# Altium schematic symbol library LTSpiceLibrary.SchLib: 776 symbols (part 1 of 3)
Pins are listed as number, name and electrical type; pins without a type are passive.

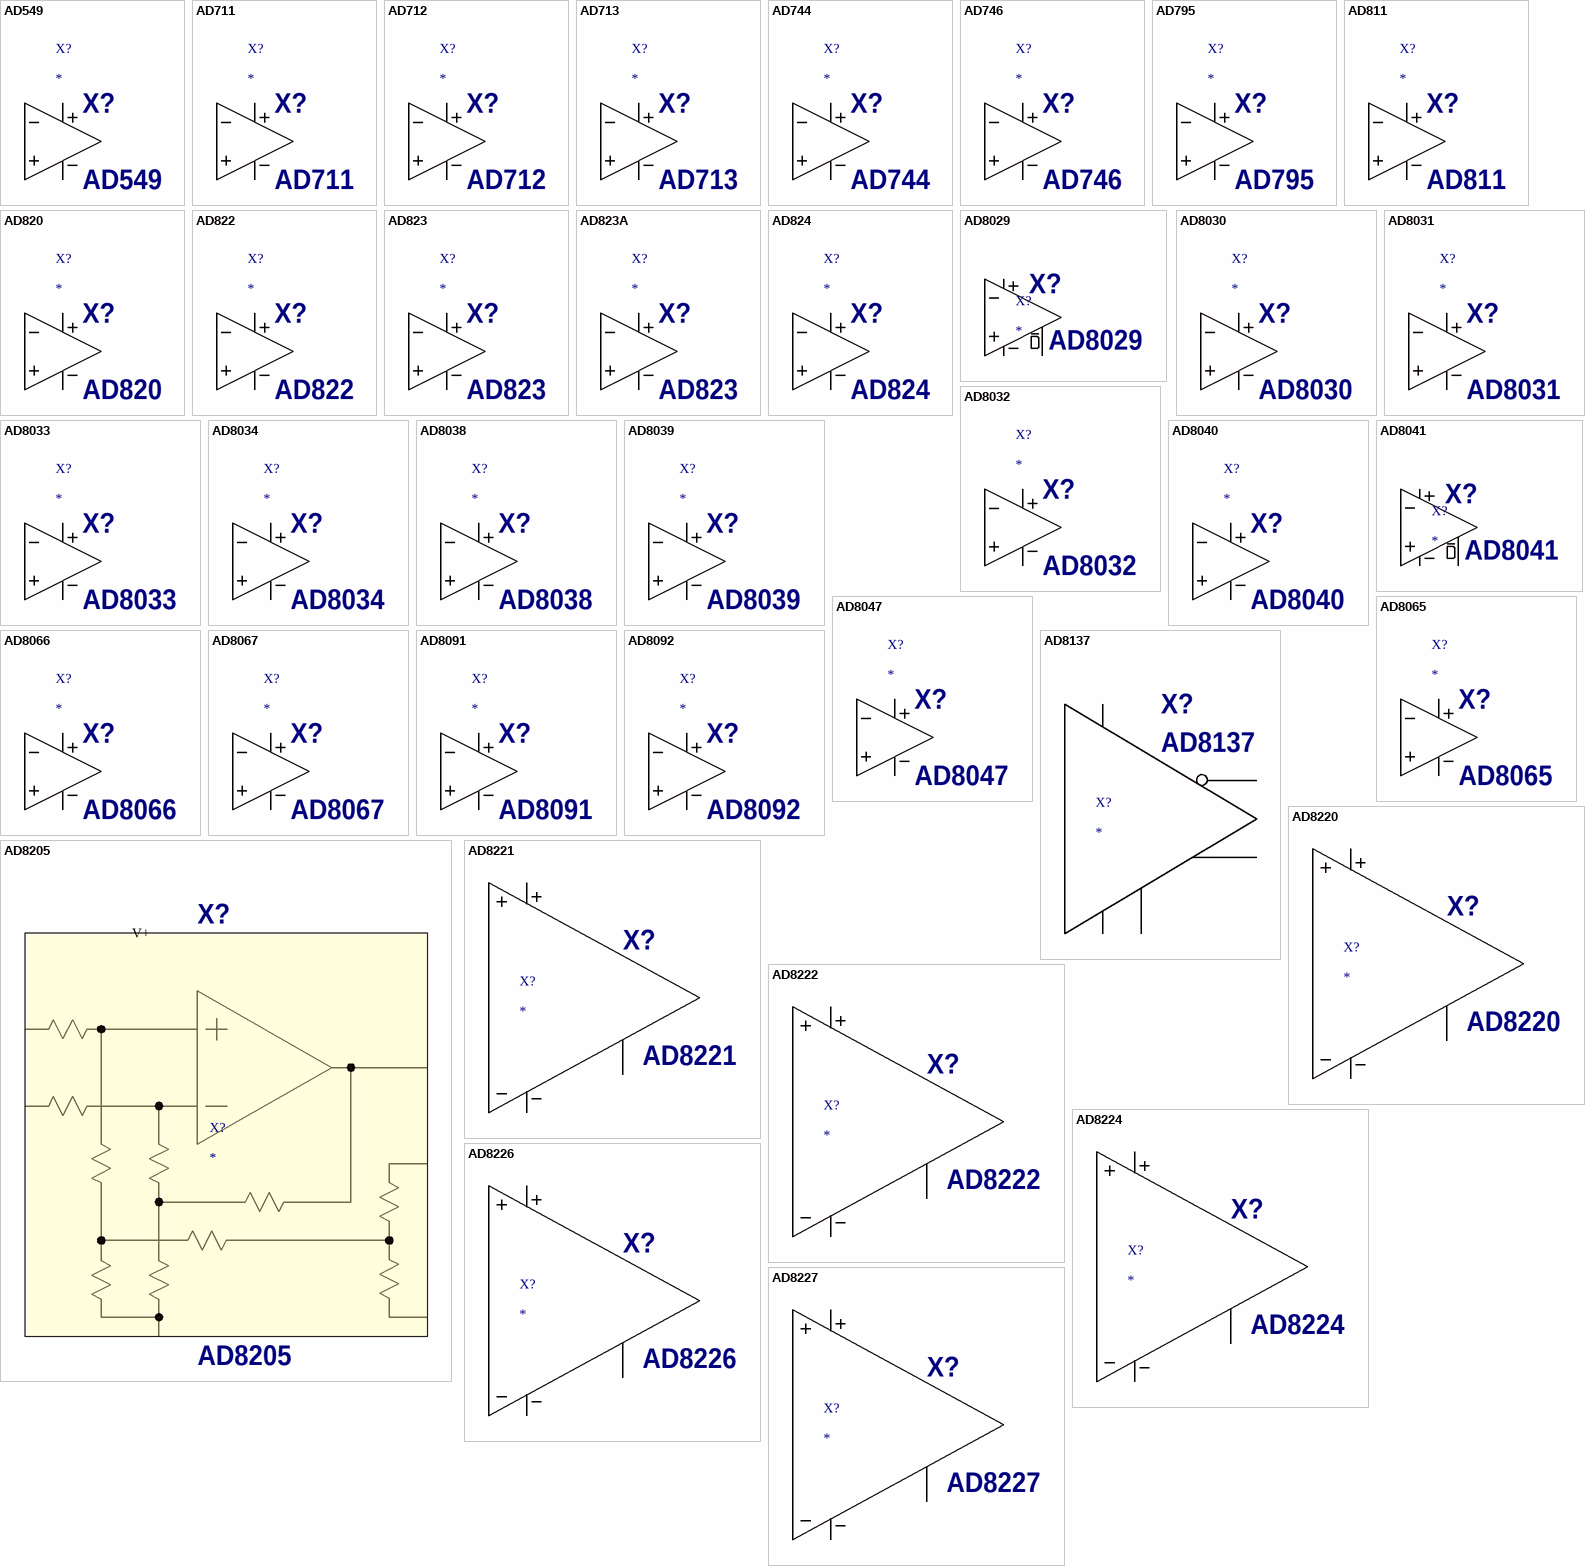
[diagram p0: symbols AD549 to AD8227]

## AD549
designator X?  value AD549  InstName: X?
Prefix: X; Description: Precision Low-Cost HS BiFET Dual Op Amp; SpiceModel: ADI1.lib; Value2: AD549
pins: 1 In+, 2 In-, 3 V+, 4 V-, 5 OUT

## AD711
designator X?  value AD711  InstName: X?
Prefix: X; Value2: AD712; Description: Precision Low-Cost HS BiFET Op Amp; SpiceModel: ADI1.lib
pins: 1 In+, 2 In-, 3 V+, 4 V-, 5 OUT

## AD712
designator X?  value AD712  InstName: X?
Prefix: X; Description: Precision Low-Cost HS BiFET Dual Op Amp; SpiceModel: ADI1.lib; Value2: AD712
pins: 1 In+, 2 In-, 3 V+, 4 V-, 5 OUT

## AD713
designator X?  value AD713  InstName: X?
Prefix: X; Value2: AD712; Description: Precision Low-Cost HS BiFET Quad Op Amp; SpiceModel: ADI1.lib
pins: 1 In+, 2 In-, 3 V+, 4 V-, 5 OUT

## AD744
designator X?  value AD744  InstName: X?
Prefix: X; Value2: AD746; Description: Precision, 500ns Settling BiFET Op Amp; SpiceModel: ADI1.lib
pins: 1 In+, 2 In-, 3 V+, 4 V-, 5 OUT

## AD746
designator X?  value AD746  InstName: X?
Prefix: X; Description: Dual Precision, 500ns Settling BiFET Op Amp; SpiceModel: ADI1.lib; Value2: AD746
pins: 1 In+, 2 In-, 3 V+, 4 V-, 5 OUT

## AD795
designator X?  value AD795  InstName: X?
Prefix: X; Description: Low Power Low Noise Precision FET Op Amp; SpiceModel: ADI1.lib; Value2: AD795
pins: 1 In+, 2 In-, 3 V+, 4 V-, 5 OUT

## AD811
designator X?  value AD811  InstName: X?
Prefix: X; Description: High Performance Video Op Amp; SpiceModel: ADI.lib; Value2: AD811
pins: 1 In+, 2 In-, 3 V+, 4 V-, 5 OUT

## AD820
designator X?  value AD820  InstName: X?
Prefix: X; Description: Single/Dual Supply Rail to Rail output Low Power FET Input Op Amp; SpiceModel: ADI1.lib; Value2: AD820
pins: 1 In+, 2 In-, 3 V+, 4 V-, 5 OUT

## AD822
designator X?  value AD822  InstName: X?
Prefix: X; Value2: AD820; Description: Dual Single/Dual Supply Rail to Rail output Low Power FET Input Op Amp; SpiceModel: ADI1.lib
pins: 1 In+, 2 In-, 3 V+, 4 V-, 5 OUT

## AD823
designator X?  value AD823  InstName: X?
Prefix: X; Description: Dual 16 MHz Rail-toRail FET Input Amplifier; SpiceModel: ADI.lib; Value2: AD823
pins: 1 In+, 2 In-, 3 V+, 4 V-, 5 OUT

## AD823A
designator X?  value AD823  InstName: X?
Prefix: X; Description: Dual 16 MHz Rail-toRail FET Input Amplifier; SpiceModel: ADI.lib; Value2: AD823
pins: 1 In+, 2 In-, 3 V+, 4 V-, 5 OUT

## AD824
designator X?  value AD824  InstName: X?
Prefix: X; Value2: AD820; Description: Quad Single/Dual Supply Rail to Rail output Low Power FET Input Op Amp; SpiceModel: ADI1.lib
pins: 1 In+, 2 In-, 3 V+, 4 V-, 5 OUT

## AD8029
designator X?  value AD8029  InstName: X?
Prefix: X; Description: High-Speed Operational Amplifier; SpiceModel: ADI.lib; Value2: AD8029
pins: 1 In+, 2 In-, 3 V+, 4 V-, 5 OUT, 6 SHDN

## AD8030
designator X?  value AD8030  InstName: X?
Prefix: X; Value2: AD8040; Description: Dual High-Speed Operational Amplifier; SpiceModel: ADI.lib
pins: 1 In+, 2 In-, 3 V+, 4 V-, 5 OUT

## AD8031
designator X?  value AD8031  InstName: X?
Prefix: X; Description: 2.7V 80 MHz rail-rail op amp; SpiceModel: ADI.lib; Value2: AD8031
pins: 1 In+, 2 In-, 3 V+, 4 V-, 5 OUT

## AD8032
designator X?  value AD8032  InstName: X?
Prefix: X; Value2: AD8031; Description: Dual 2.7V 80 MHz rail-rail op amp; SpiceModel: ADI.lib
pins: 1 In+, 2 In-, 3 V+, 4 V-, 5 OUT

## AD8033
designator X?  value AD8033  InstName: X?
Prefix: X; Description: 85MHz  FET Input Amplifier; SpiceModel: ADI.lib; Value2: AD8033
pins: 1 In+, 2 In-, 3 V+, 4 V-, 5 OUT

## AD8034
designator X?  value AD8034  InstName: X?
Prefix: X; Value2: AD8033; Description: Dual 85MHz  FET Input Amplifier; SpiceModel: ADI.lib
pins: 1 In+, 2 In-, 3 V+, 4 V-, 5 OUT

## AD8038
designator X?  value AD8038  InstName: X?
Prefix: X; Description: Low-Power 350MHz op amp; SpiceModel: ADI.lib; Value2: AD8038
pins: 1 In+, 2 In-, 3 V+, 4 V-, 5 OUT

## AD8039
designator X?  value AD8039  InstName: X?
Prefix: X; Value2: AD8038; Description: Dual Low-Power 350MHz op amp; SpiceModel: ADI.lib
pins: 1 In+, 2 In-, 3 V+, 4 V-, 5 OUT

## AD8040
designator X?  value AD8040  InstName: X?
Prefix: X; Description: Quad High-Speed Operational Amplifier; SpiceModel: ADI.lib; Value2: AD8040
pins: 1 In+, 2 In-, 3 V+, 4 V-, 5 OUT

## AD8041
designator X?  value AD8041  InstName: X?
Prefix: X; Description: 160MHz Rail-to-Rail Amplifier with Disable; SpiceModel: ADI.lib; Value2: AD8041
pins: 1 In+, 2 In-, 3 V+, 4 V-, 5 OUT, 6 SHDN

## AD8047
designator X?  value AD8047  InstName: X?
Prefix: X; Description: 250MHz (G=1) voltage feedback op amp; SpiceModel: ADI.lib; Value2: AD8047
pins: 1 In+, 2 In-, 3 V+, 4 V-, 5 OUT

## AD8065
designator X?  value AD8065  InstName: X?
Prefix: X; Description: Single 135MHz low noise FET Input Amp; SpiceModel: ADI.lib; Value2: AD8065
pins: 1 In+, 2 In-, 3 V+, 4 V-, 5 OUT

## AD8066
designator X?  value AD8066  InstName: X?
Prefix: X; Description: Dual low-cost high-speed FET input amp; SpiceModel: ADI.lib; Value2: AD8066
pins: 1 In+, 2 In-, 3 V+, 4 V-, 5 OUT

## AD8067
designator X?  value AD8067  InstName: X?
Prefix: X; Description: 250MHz Precision FastFET Op-Amp; SpiceModel: ADI.lib; Value2: AD8067
pins: 1 In+, 2 In-, 3 V+, 4 V-, 5 OUT

## AD8091
designator X?  value AD8091  InstName: X?
Prefix: X; Description: Single 110MHz rail-to-rail op amp 2.7V; SpiceModel: ADI.lib; Value2: AD8091
pins: 1 In+, 2 In-, 3 V+, 4 V-, 5 OUT

## AD8092
designator X?  value AD8092  InstName: X?
Prefix: X; Description: Dual 110MHz rail-to-rail op amp 2.7V; SpiceModel: ADI.lib; Value2: AD8092
pins: 1 In+, 2 In-, 3 V+, 4 V-, 5 OUT

## AD8137
designator X?  value AD8137  InstName: X?
Prefix: X; Description: Low Cost, Low Power, Differential ADC Driver; SpiceModel: AD8137.lib; Value2: AD8137
pins: 1 3a, 2 9, 3 99, 4 50, 5 71B, 6 71, 7 110

## AD8205
designator X?  value AD8205  InstName: X?
Prefix: X; Description: Single-Supply 42V System Difference Amplifier; SpiceModel: ADI.lib; Value2: AD8205
pins: 1 -IN, 2 GND, 3 Vref2, 4 OUT, 5 V+, 6 Vref1, 7 +IN

## AD8220
designator X?  value AD8220  InstName: X?
Prefix: X; Description: JFET Input In-Amp with R-R Out in MSOP pkg; SpiceModel: ADI1.lib; Value2: AD8220
pins: 1 IN-, 2 RG1, 3 RG2, 4 IN+, 5 VEE, 6 REF, 7 OUT, 8 VCC

## AD8221
designator X?  value AD8221  InstName: X?
Prefix: X; Description: Precision In-Amp; SpiceModel: ADI1.lib; Value2: AD8221
pins: 1 IN-, 2 RG1, 3 RG2, 4 IN+, 5 VEE, 6 REF, 7 OUT, 8 VCC

## AD8222
designator X?  value AD8222  InstName: X?
Prefix: X; Description: Precision Dual Channel In-Amp; SpiceModel: ADI1.lib; Value2: AD8222
pins: 1 IN-, 2 RG1, 3 RG2, 4 IN+, 5 VEE, 6 REF, 7 OUT, 8 VCC

## AD8224
designator X?  value AD8224  InstName: X?
Prefix: X; Description: Precision Dual Channel JFET R-R in In-Amp; SpiceModel: ADI1.lib; Value2: AD8224
pins: 1 IN-, 2 RG1, 3 RG2, 4 IN+, 5 VEE, 6 REF, 7 OUT, 8 VCC

## AD8226
designator X?  value AD8226  InstName: X?
Prefix: X; Description: Wide Supply Range R-R output In-Amp; SpiceModel: ADI1.lib; Value2: AD8226
pins: 1 IN-, 2 RG1, 3 RG2, 4 IN+, 5 VEE, 6 REF, 7 OUT, 8 VCC

## AD8227
designator X?  value AD8227  InstName: X?
Prefix: X; Description: Wide Supply Range R-R output In-Amp; SpiceModel: ADI1.lib; Value2: AD8227
pins: 1 IN-, 2 RG1, 3 RG2, 4 IN+, 5 VEE, 6 REF, 7 OUT, 8 VCC

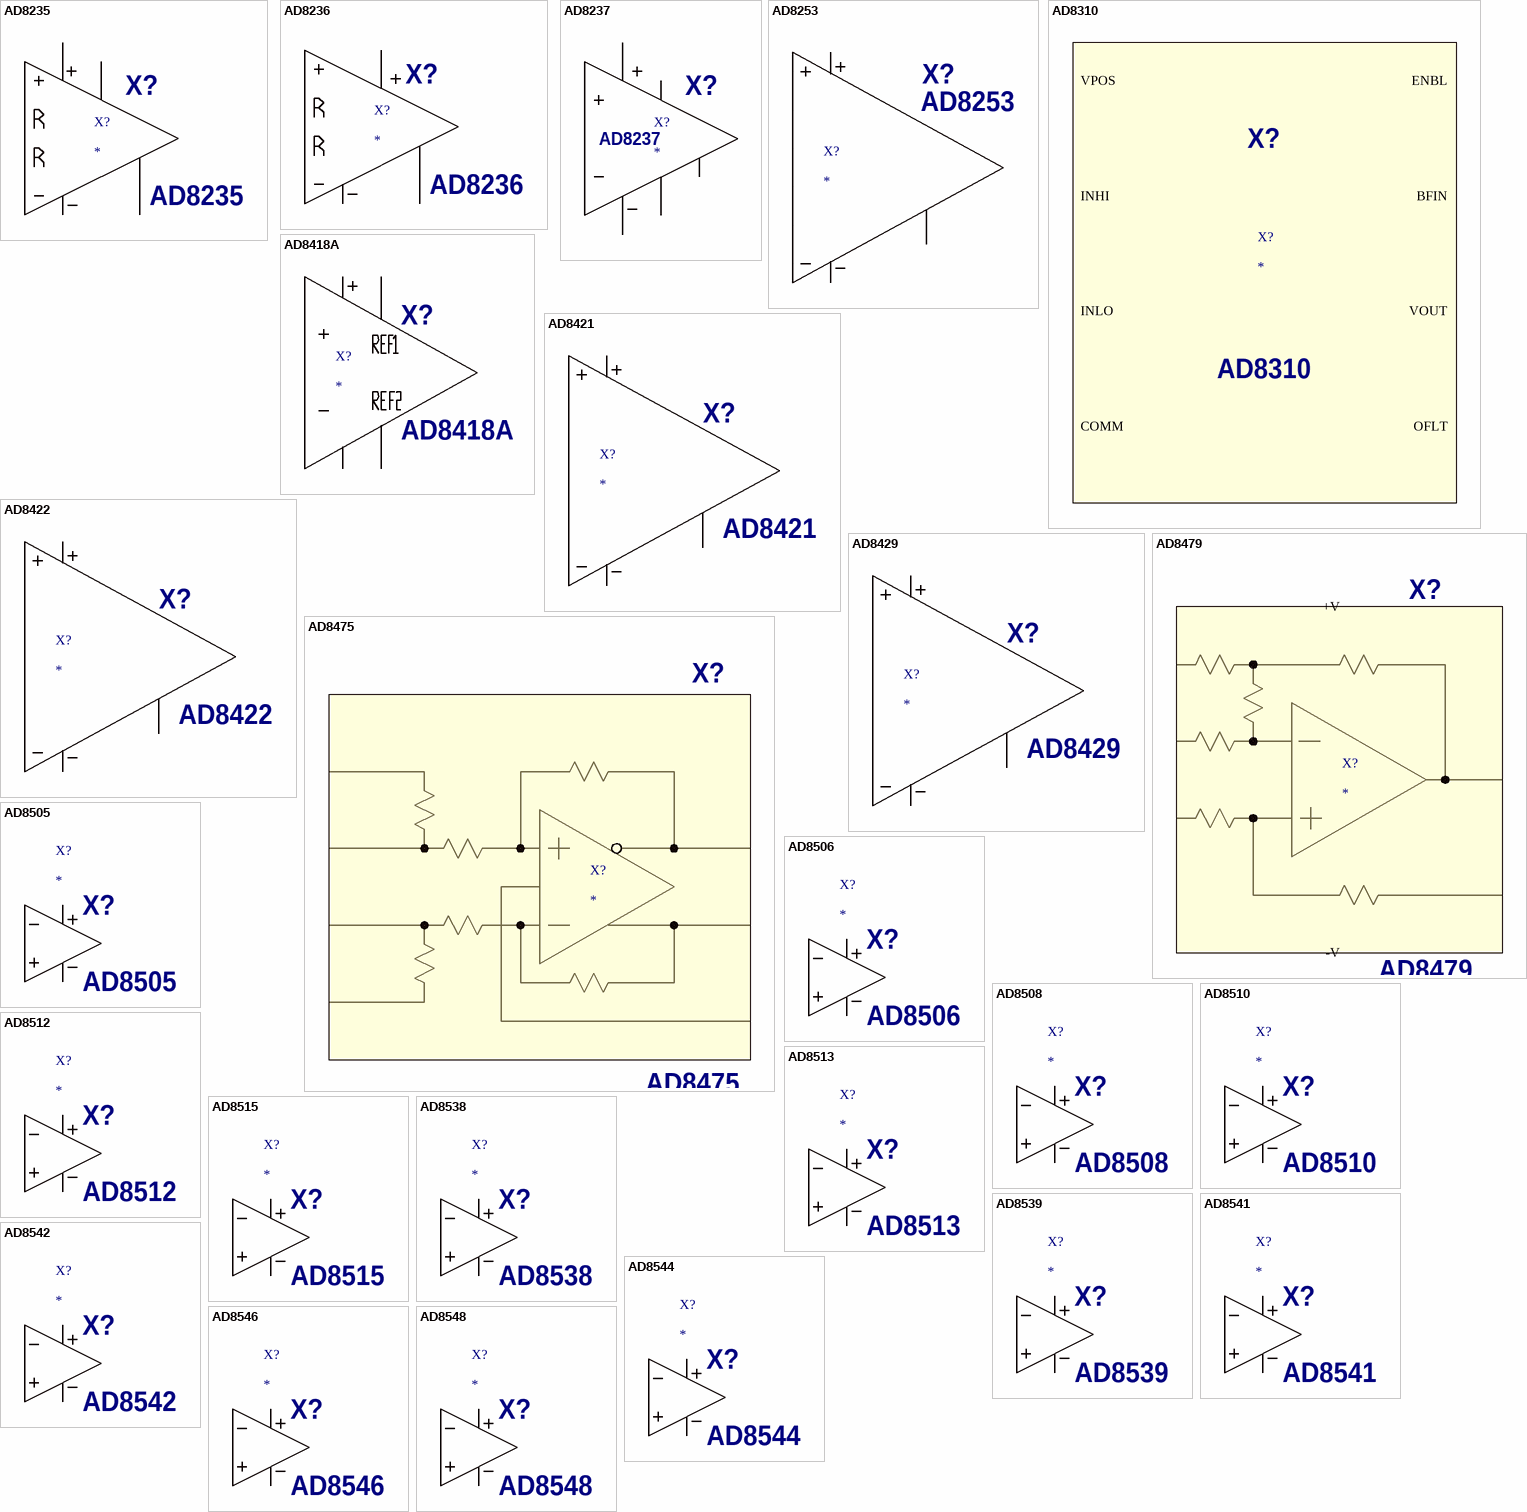
[diagram p1: symbols AD8235 to AD8548]

## AD8235
designator X?  value AD8235  InstName: X?
Prefix: X; Description: �Power Precision Instrumentation Amplifier; SpiceModel: ADI1.lib; Value2: AD8235
pins: 1 FB, 2 RG2, 3 RG1, 4 In+, 5 SDN, 6 V-, 7 REF, 8 OUT, 9 V+

## AD8236
designator X?  value AD8236  InstName: X?
Prefix: X; Description: 40 �A �Power Instrumentation Amplifier w/zero Crossover Distortion; SpiceModel: ADI1.lib; Value2: AD8236
pins: 1 FB, 2 RG2, 3 RG1, 4 In+, 5 V-, 6 REF, 7 OUT, 8 V+

## AD8237
designator X?  value AD8237  InstName: X?
Prefix: X; Description: Micropower, Zero Drift, True Rail-to-Rail Instrumentation Amplifier; ModelFile: AD8237.lib
pins: 1, 2, 3, 4, 5, 6, 7, 8

## AD8253
designator X?  value AD8253  InstName: X?
Prefix: X; Description: 10 MHz, 20 V/us, G=1, 10, 100, 1000 iCMOS Programmable Gain Instrumentation Amplifier; SpiceModel: AD8253.lib; Value2: AD8253
pins: 1 -IN, 2 DGND, 3 -VS, 4 A0, 5 A1, 6 WR, 7 OUT, 8 +VS, 9 REF, 10 +IN

## AD8310
designator X?  value AD8310  InstName: X?
Prefix: X; Description: Fast, Voltage-Out, DC to 440MHz, 95dB Logartihmic Amplifier; SpiceModel: AD8310.lib; Value2: AD8310
pins: 1 INLO, 2 COMM, 3 OFLT, 4 VOUT, 5 VPOS, 6 BFIN, 7 ENBL, 8 INHI

## AD8418A
designator X?  value AD8418A  InstName: X?
Prefix: X; Description: Bidirectional G of 20 Current Sense Amplifier; SpiceModel: ADI1.lib; Value2: AD8418A
pins: 1 IN-, 2 GND, 3 REF2, 4 OUT, 5 VS, 6 REF1, 7 IN+

## AD8421
designator X?  value AD8421  InstName: X?
Prefix: X; Description: 3 nV/"Hz, Low Power In-Amp; SpiceModel: ADI1.lib; Value2: AD8421
pins: 1 IN-, 2 RG1, 3 RG2, 4 IN+, 5 VEE, 6 REF, 7 OUT, 8 VCC

## AD8422
designator X?  value AD8422  InstName: X?
Prefix: X; Description: High Performance, Low Power, R-R Precision In-Amp; SpiceModel: ADI1.lib; Value2: AD8422
pins: 1 IN-, 2 RG1, 3 RG2, 4 IN+, 5 VEE, 6 REF, 7 OUT, 8 VCC

## AD8429
designator X?  value AD8429  InstName: X?
Prefix: X; Description: 1 nV/"Hz Low Noise In-Amp; SpiceModel: ADI1.lib; Value2: AD8429
pins: 1 IN-, 2 RG1, 3 RG2, 4 IN+, 5 VEE, 6 REF, 7 OUT, 8 VCC

## AD8475
designator X?  value AD8475  InstName: X?
Prefix: X; Description: Precision, Selectable Gain, Fully Differential Funnel Amplifier; SpiceModel: AD8475.lib; Value2: AD8475
pins: 1 -IN 0.8x, 2 -IN 0.4x, 3 +VS, 4 VOCM, 5 +OUT, 6 -OUT, 7 -VS, 8 +IN 0.4x, 9 +IN 0.8x

## AD8479
designator X?  value AD8479  InstName: X?
Prefix: X; Description: Very High Common-Mode Voltage Precision Difference Amplifier; SpiceModel: ADI.lib; Value2: AD8479
pins: 1 REF-, 2 -IN, 3 +IN, 4 -V, 5 REF+, 6 OUTPUT, 7 +V

## AD8505
designator X?  value AD8505  InstName: X?
Prefix: X; Description: 20 �A Maximum, Rail-to-Rail I/O, Zero Input Crossover Distortion Amplifier; Value2: AD8505; SpiceModel: ADI1.lib
pins: 1 In+, 2 In-, 3 V+, 4 V-, 5 OUT

## AD8506
designator X?  value AD8506  InstName: X?
Prefix: X; Description: Dual 20 �A maximum Rail to Rail I/O Zero Input Crossover Distortion Amplifier; Value2: AD8506; SpiceModel: ADI1.lib
pins: 1 In+, 2 In-, 3 V+, 4 V-, 5 OUT

## AD8508
designator X?  value AD8508  InstName: X?
Prefix: X; Description: Quad 20 �A maximum Rail to Rail I/O Zero Input Crossover Distortion Amplifier; Value2: AD8508; SpiceModel: ADI1.lib
pins: 1 In+, 2 In-, 3 V+, 4 V-, 5 OUT

## AD8510
designator X?  value AD8510  InstName: X?
Prefix: X; Description: Very Low Noise, Low Input Bias Current, Wide Bandwidth JFET Operational Amplifier; SpiceModel: ADI.lib; Value2: AD8510
pins: 1 In+, 2 In-, 3 V+, 4 V-, 5 OUT

## AD8512
designator X?  value AD8512  InstName: X?
Prefix: X; Value2: AD8510; Description: Dual Very Low Noise, Low Input Bias Current, Wide Bandwidth JFET Operational Amplifier; SpiceModel: ADI.lib
pins: 1 In+, 2 In-, 3 V+, 4 V-, 5 OUT

## AD8513
designator X?  value AD8513  InstName: X?
Prefix: X; Value2: AD8510; Description: Quad Very Low Noise, Low Input Bias Current, Wide Bandwidth JFET Operational Amplifier; SpiceModel: ADI.lib
pins: 1 In+, 2 In-, 3 V+, 4 V-, 5 OUT

## AD8515
designator X?  value AD8515  InstName: X?
Prefix: X; Description: 1.8/5V CMOS OP Low Pwr RRIO; SpiceModel: ADI.lib; Value2: AD8515
pins: 1 In+, 2 In-, 3 V+, 4 V-, 5 OUT

## AD8538
designator X?  value AD8538  InstName: X?
Prefix: X; Description: 2.7/5V, CMOS, OP, Zero Drift, RRIO, Single; SpiceModel: ADI.lib; Value2: AD8538
pins: 1 In+, 2 In-, 3 V+, 4 V-, 5 OUT

## AD8539
designator X?  value AD8539  InstName: X?
Prefix: X; Description: 2.7/5V, CMOS, OP, Zero Drift, RRIO, Dual; SpiceModel: ADI.lib; Value2: AD8539
pins: 1 In+, 2 In-, 3 V+, 4 V-, 5 OUT

## AD8541
designator X?  value AD8541  InstName: X?
Prefix: X; Description: 2.7/5V CMOS OP Low Pwr RRIO; SpiceModel: AD8541.lib; Value2: AD8541
pins: 1 In+, 2 In-, 3 V+, 4 V-, 5 OUT

## AD8542
designator X?  value AD8542  InstName: X?
Prefix: X; Description: 2.7/5V CMOS OP Low Pwr RRIO; SpiceModel: ADI.lib; Value2: AD8542
pins: 1 In+, 2 In-, 3 V+, 4 V-, 5 OUT

## AD8544
designator X?  value AD8544  InstName: X?
Prefix: X; Description: 2.7/5V CMOS OP Low Pwr RRIO; SpiceModel: ADI.lib; Value2: AD8544
pins: 1 In+, 2 In-, 3 V+, 4 V-, 5 OUT

## AD8546
designator X?  value AD8546  InstName: X?
Prefix: X; Description: 3/18V CMOS OP Low Pwr RRIO; SpiceModel: ADI.lib; Value2: AD8546
pins: 1 In+, 2 In-, 3 V+, 4 V-, 5 OUT

## AD8548
designator X?  value AD8548  InstName: X?
Prefix: X; Description: 3/18V CMOS OP Low Pwr RRIO; SpiceModel: ADI.lib; Value2: AD8548
pins: 1 In+, 2 In-, 3 V+, 4 V-, 5 OUT

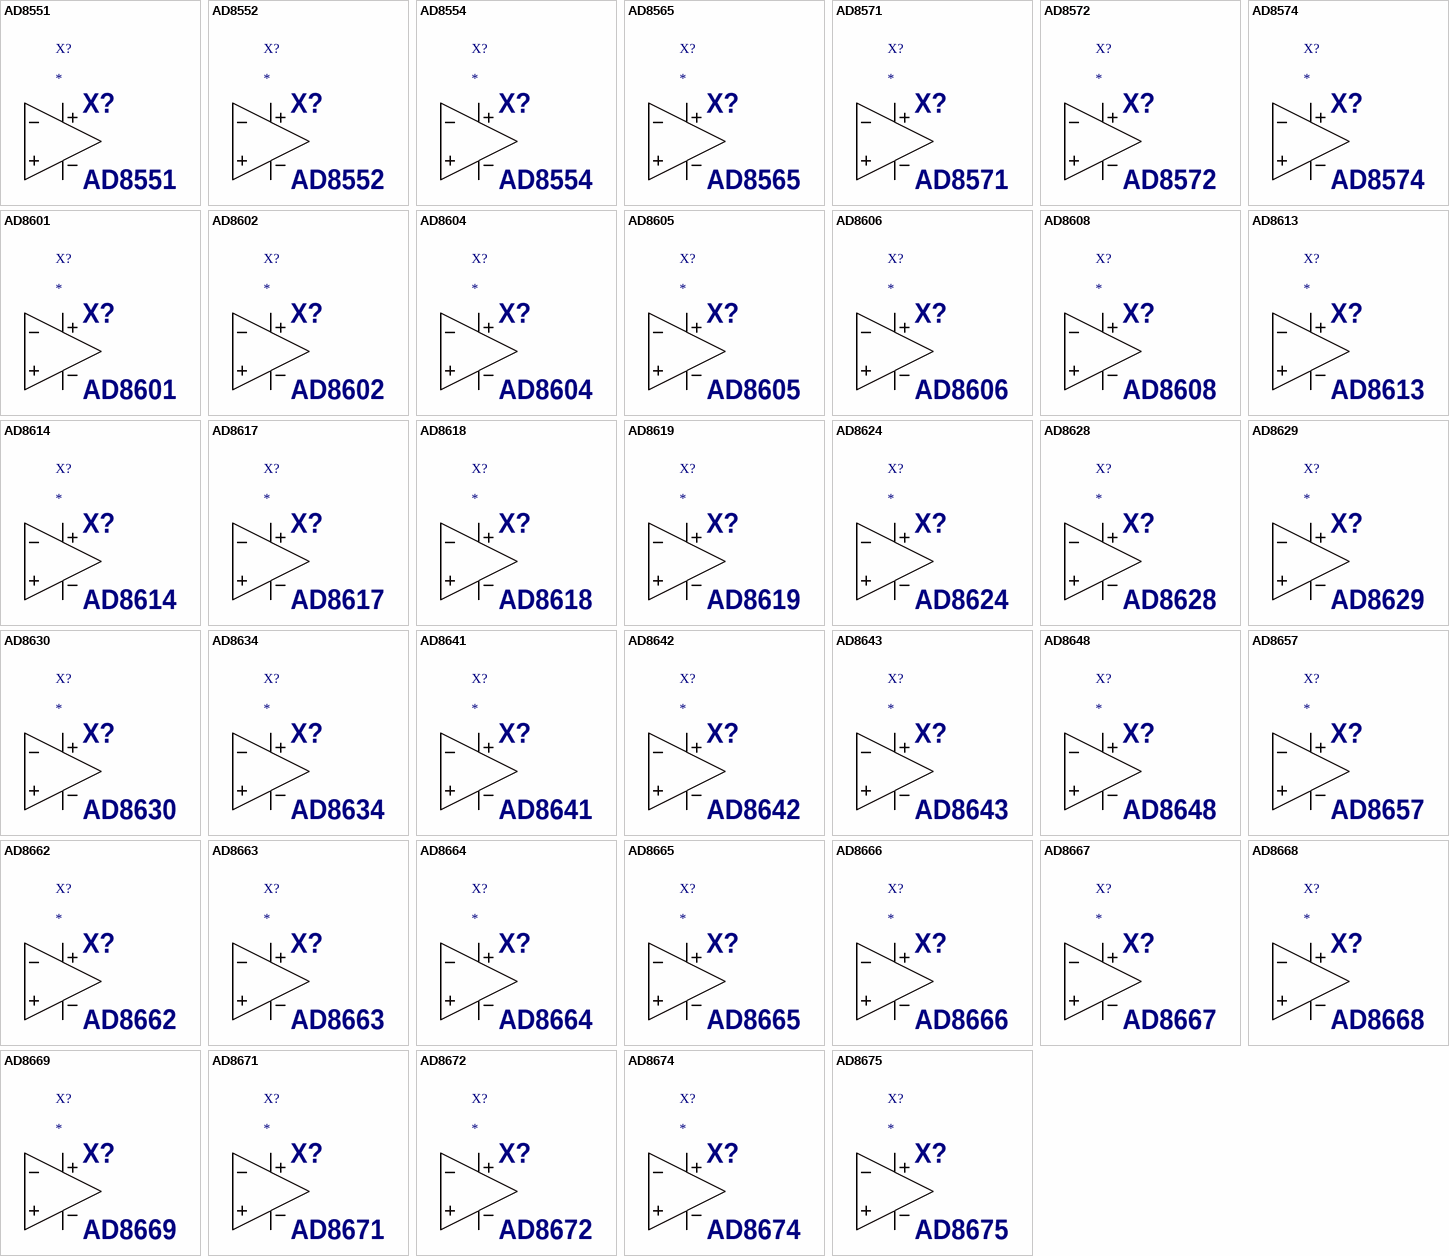
[diagram p2: symbols AD8551 to AD8675]

## AD8551
designator X?  value AD8551  InstName: X?
Prefix: X; Description: 2.7/5V, CMOS, OP, Zero Drift, RRIO, Single; SpiceModel: ADI.lib; Value2: AD8551
pins: 1 In+, 2 In-, 3 V+, 4 V-, 5 OUT

## AD8552
designator X?  value AD8552  InstName: X?
Prefix: X; Description: 2.7/5V, CMOS, OP, Zero Drift, RRIO, Dual; SpiceModel: ADI.lib; Value2: AD8552
pins: 1 In+, 2 In-, 3 V+, 4 V-, 5 OUT

## AD8554
designator X?  value AD8554  InstName: X?
Prefix: X; Description: 2.7/5V, CMOS, OP, Zero Drift, RRIO, Quad; SpiceModel: ADI.lib; Value2: AD8554
pins: 1 In+, 2 In-, 3 V+, 4 V-, 5 OUT

## AD8565
designator X?  value AD8565  InstName: X?
Prefix: X; Description: 16 V Rail-to-Rail Operational Amplifier (Single); SpiceModel: ADI1.lib; Value2: AD8565
pins: 1 In+, 2 In-, 3 V+, 4 V-, 5 OUT

## AD8571
designator X?  value AD8571  InstName: X?
Prefix: X; Description: 2.7/5V, CMOS, OP, Zero Drift, RRIO, Single; SpiceModel: ADI.lib; Value2: AD8571
pins: 1 In+, 2 In-, 3 V+, 4 V-, 5 OUT

## AD8572
designator X?  value AD8572  InstName: X?
Prefix: X; Description: 2.7/5V, CMOS, OP, Zero Drift, RRIO, Dual; SpiceModel: ADI.lib; Value2: AD8572
pins: 1 In+, 2 In-, 3 V+, 4 V-, 5 OUT

## AD8574
designator X?  value AD8574  InstName: X?
Prefix: X; Description: 2.7/5V, CMOS, OP, Zero Drift, RRIO, Quad; SpiceModel: ADI.lib; Value2: AD8574
pins: 1 In+, 2 In-, 3 V+, 4 V-, 5 OUT

## AD8601
designator X?  value AD8601  InstName: X?
Prefix: X; Description: 2.7/5V CMOS OP Low Vos RRIO; SpiceModel: ADI.lib; Value2: AD8601
pins: 1 In+, 2 In-, 3 V+, 4 V-, 5 OUT

## AD8602
designator X?  value AD8602  InstName: X?
Prefix: X; Description: 2.7/5V CMOS OP Low Vos RRIO; SpiceModel: ADI.lib; Value2: AD8602
pins: 1 In+, 2 In-, 3 V+, 4 V-, 5 OUT

## AD8604
designator X?  value AD8604  InstName: X?
Prefix: X; Description: 2.7/5V CMOS OP Low Vos RRIO; SpiceModel: ADI.lib; Value2: AD8604
pins: 1 In+, 2 In-, 3 V+, 4 V-, 5 OUT

## AD8605
designator X?  value AD8605  InstName: X?
Prefix: X; Description: 2.7/5V CMOS OP Low Noise RRIO; SpiceModel: ADI.lib; Value2: AD8605
pins: 1 In+, 2 In-, 3 V+, 4 V-, 5 OUT

## AD8606
designator X?  value AD8606  InstName: X?
Prefix: X; Description: 7/5V CMOS OP Low Noise RRIO; SpiceModel: ADI.lib; Value2: AD8606
pins: 1 In+, 2 In-, 3 V+, 4 V-, 5 OUT

## AD8608
designator X?  value AD8608  InstName: X?
Prefix: X; Description: 2.7/5V CMOS OP Low Noise RRIO; SpiceModel: ADI.lib; Value2: AD8608
pins: 1 In+, 2 In-, 3 V+, 4 V-, 5 OUT

## AD8613
designator X?  value AD8613  InstName: X?
Prefix: X; Description: Low Cost Micropower, Low Noise CMOS Rail-to-Rail, Input/Output Operational Amplifier; Value2: AD8613; SpiceModel: ADI1.lib
pins: 1 In+, 2 In-, 3 V+, 4 V-, 5 OUT

## AD8614
designator X?  value AD8614  InstName: X?
Prefix: X; Description: Single high-voltage LCD driver; SpiceModel: ADI.lib; Value2: AD8614
pins: 1 In+, 2 In-, 3 V+, 4 V-, 5 OUT

## AD8617
designator X?  value AD8617  InstName: X?
Prefix: X; Description: Dual Low Cost Micropower, Low Noise CMOS Rail-to-Rail, Input/Output Operational Amplifier; Value2: AD8617; SpiceModel: ADI1.lib
pins: 1 In+, 2 In-, 3 V+, 4 V-, 5 OUT

## AD8618
designator X?  value AD8618  InstName: X?
Prefix: X; Description: 2.7/5V CMOS OP Fast RRIO; SpiceModel: ADI.lib; Value2: AD8618
pins: 1 In+, 2 In-, 3 V+, 4 V-, 5 OUT

## AD8619
designator X?  value AD8619  InstName: X?
Prefix: X; Description: Quad Low Cost Micropower, Low Noise CMOS Rail-to-Rail, Input/Output Operational Amplifier; Value2: AD8619; SpiceModel: ADI1.lib
pins: 1 In+, 2 In-, 3 V+, 4 V-, 5 OUT

## AD8624
designator X?  value AD8624  InstName: X?
Prefix: X; Description: 5/30V BIP OP Low Noise RRO; SpiceModel: ADI.lib; Value2: AD8624
pins: 1 In+, 2 In-, 3 V+, 4 V-, 5 OUT

## AD8628
designator X?  value AD8628  InstName: X?
Prefix: X; Description: 2.7/5V, CMOS, OP, Zero Drift, RRIO, Single; SpiceModel: ADI.lib; Value2: AD8628
pins: 1 In+, 2 In-, 3 V+, 4 V-, 5 OUT

## AD8629
designator X?  value AD8629  InstName: X?
Prefix: X; Description: 2.7/5V, CMOS, OP, Zero Drift, RRIO, Dual; SpiceModel: ADI.lib; Value2: AD8629
pins: 1 In+, 2 In-, 3 V+, 4 V-, 5 OUT

## AD8630
designator X?  value AD8630  InstName: X?
Prefix: X; Description: 2.7/5V, CMOS, OP, Zero Drift, RRIO, Quad; SpiceModel: ADI.lib; Value2: AD8630
pins: 1 In+, 2 In-, 3 V+, 4 V-, 5 OUT

## AD8634
designator X?  value AD8634  InstName: X?
Prefix: X; Description: High Temp Low Power Dual Op Amp; SpiceModel: ADI1.lib; Value2: AD8634
pins: 1 In+, 2 In-, 3 V+, 4 V-, 5 OUT

## AD8641
designator X?  value AD8641  InstName: X?
Prefix: X; Description: 5/26V JFET OP RRO Single Supply; SpiceModel: ADI.lib; Value2: AD8641
pins: 1 In+, 2 In-, 3 V+, 4 V-, 5 OUT

## AD8642
designator X?  value AD8642  InstName: X?
Prefix: X; Description: 5/26V JFET OP RRO Single Supply; SpiceModel: ADI.lib; Value2: AD8642
pins: 1 In+, 2 In-, 3 V+, 4 V-, 5 OUT

## AD8643
designator X?  value AD8643  InstName: X?
Prefix: X; Description: 5/26V JFET OP RRO Single Supply; SpiceModel: ADI.lib; Value2: AD8643
pins: 1 In+, 2 In-, 3 V+, 4 V-, 5 OUT

## AD8648
designator X?  value AD8648  InstName: X?
Prefix: X; Description: 2.7/5V CMOS OP Fast RRIO; SpiceModel: ADI.lib; Value2: AD8648
pins: 1 In+, 2 In-, 3 V+, 4 V-, 5 OUT

## AD8657
designator X?  value AD8657  InstName: X?
Prefix: X; Description: Dual 22 �A, RRIO, CMOS,18 V Op-Amp; SpiceModel: ADI1.lib; Value2: AD8657
pins: 1 In+, 2 In-, 3 V+, 4 V-, 5 OUT

## AD8662
designator X?  value AD8662  InstName: X?
Prefix: X; Description: Dual Low Noise, Precision 16 V CMOS, Rail-to-Rail Operational Amplifiers; Value2: AD8662; SpiceModel: ADI1.lib
pins: 1 In+, 2 In-, 3 V+, 4 V-, 5 OUT

## AD8663
designator X?  value AD8663  InstName: X?
Prefix: X; Description: 5/16V CMOS OP Low Noise Single Supply; SpiceModel: ADI.lib; Value2: AD8663
pins: 1 In+, 2 In-, 3 V+, 4 V-, 5 OUT

## AD8664
designator X?  value AD8664  InstName: X?
Prefix: X; Description: Quad Low Noise, Precision 16 V CMOS, Rail-to-Rail Operational Amplifiers; Value2: AD8664; SpiceModel: ADI1.lib
pins: 1 In+, 2 In-, 3 V+, 4 V-, 5 OUT

## AD8665
designator X?  value AD8665  InstName: X?
Prefix: X; Description: 16 V, 4 MHz RR0 Amplifier; Value2: AD8665; SpiceModel: ADI1.lib
pins: 1 In+, 2 In-, 3 V+, 4 V-, 5 OUT

## AD8666
designator X?  value AD8666  InstName: X?
Prefix: X; Description: Dual 16 V, 4 MHz RR0 Amplifier; Value2: AD8666; SpiceModel: ADI1.lib
pins: 1 In+, 2 In-, 3 V+, 4 V-, 5 OUT

## AD8667
designator X?  value AD8667  InstName: X?
Prefix: X; Description: 5/16V CMOS OP Low Noise Single Supply; SpiceModel: ADI.lib; Value2: AD8667
pins: 1 In+, 2 In-, 3 V+, 4 V-, 5 OUT

## AD8668
designator X?  value AD8668  InstName: X?
Prefix: X; Description: Quad 16 V, 4 MHz RR0 Amplifier; Value2: AD8668; SpiceModel: ADI1.lib
pins: 1 In+, 2 In-, 3 V+, 4 V-, 5 OUT

## AD8669
designator X?  value AD8669  InstName: X?
Prefix: X; Description: 5/16V CMOS OP Low Noise Single Supply; SpiceModel: ADI.lib; Value2: AD8669
pins: 1 In+, 2 In-, 3 V+, 4 V-, 5 OUT

## AD8671
designator X?  value AD8671  InstName: X?
Prefix: X; Description: 10/30V BIP OP Low Noise Low Ib; SpiceModel: ADI.lib; Value2: AD8671
pins: 1 In+, 2 In-, 3 V+, 4 V-, 5 OUT

## AD8672
designator X?  value AD8672  InstName: X?
Prefix: X; Description: 10/30V BIP OP Low Noise Low Ib; SpiceModel: ADI.lib; Value2: AD8672
pins: 1 In+, 2 In-, 3 V+, 4 V-, 5 OUT

## AD8674
designator X?  value AD8674  InstName: X?
Prefix: X; Description: 10/30V BIP OP Low Noise Low Ib; SpiceModel: ADI.lib; Value2: AD8674
pins: 1 In+, 2 In-, 3 V+, 4 V-, 5 OUT

## AD8675
designator X?  value AD8675  InstName: X?
Prefix: X; Description: 36V Precision, 2.8nV/"Hz Rail-to-Rail Output Op Amp; SpiceModel: ADI.lib; Value2: AD8675
pins: 1 In+, 2 In-, 3 V+, 4 V-, 5 OUT

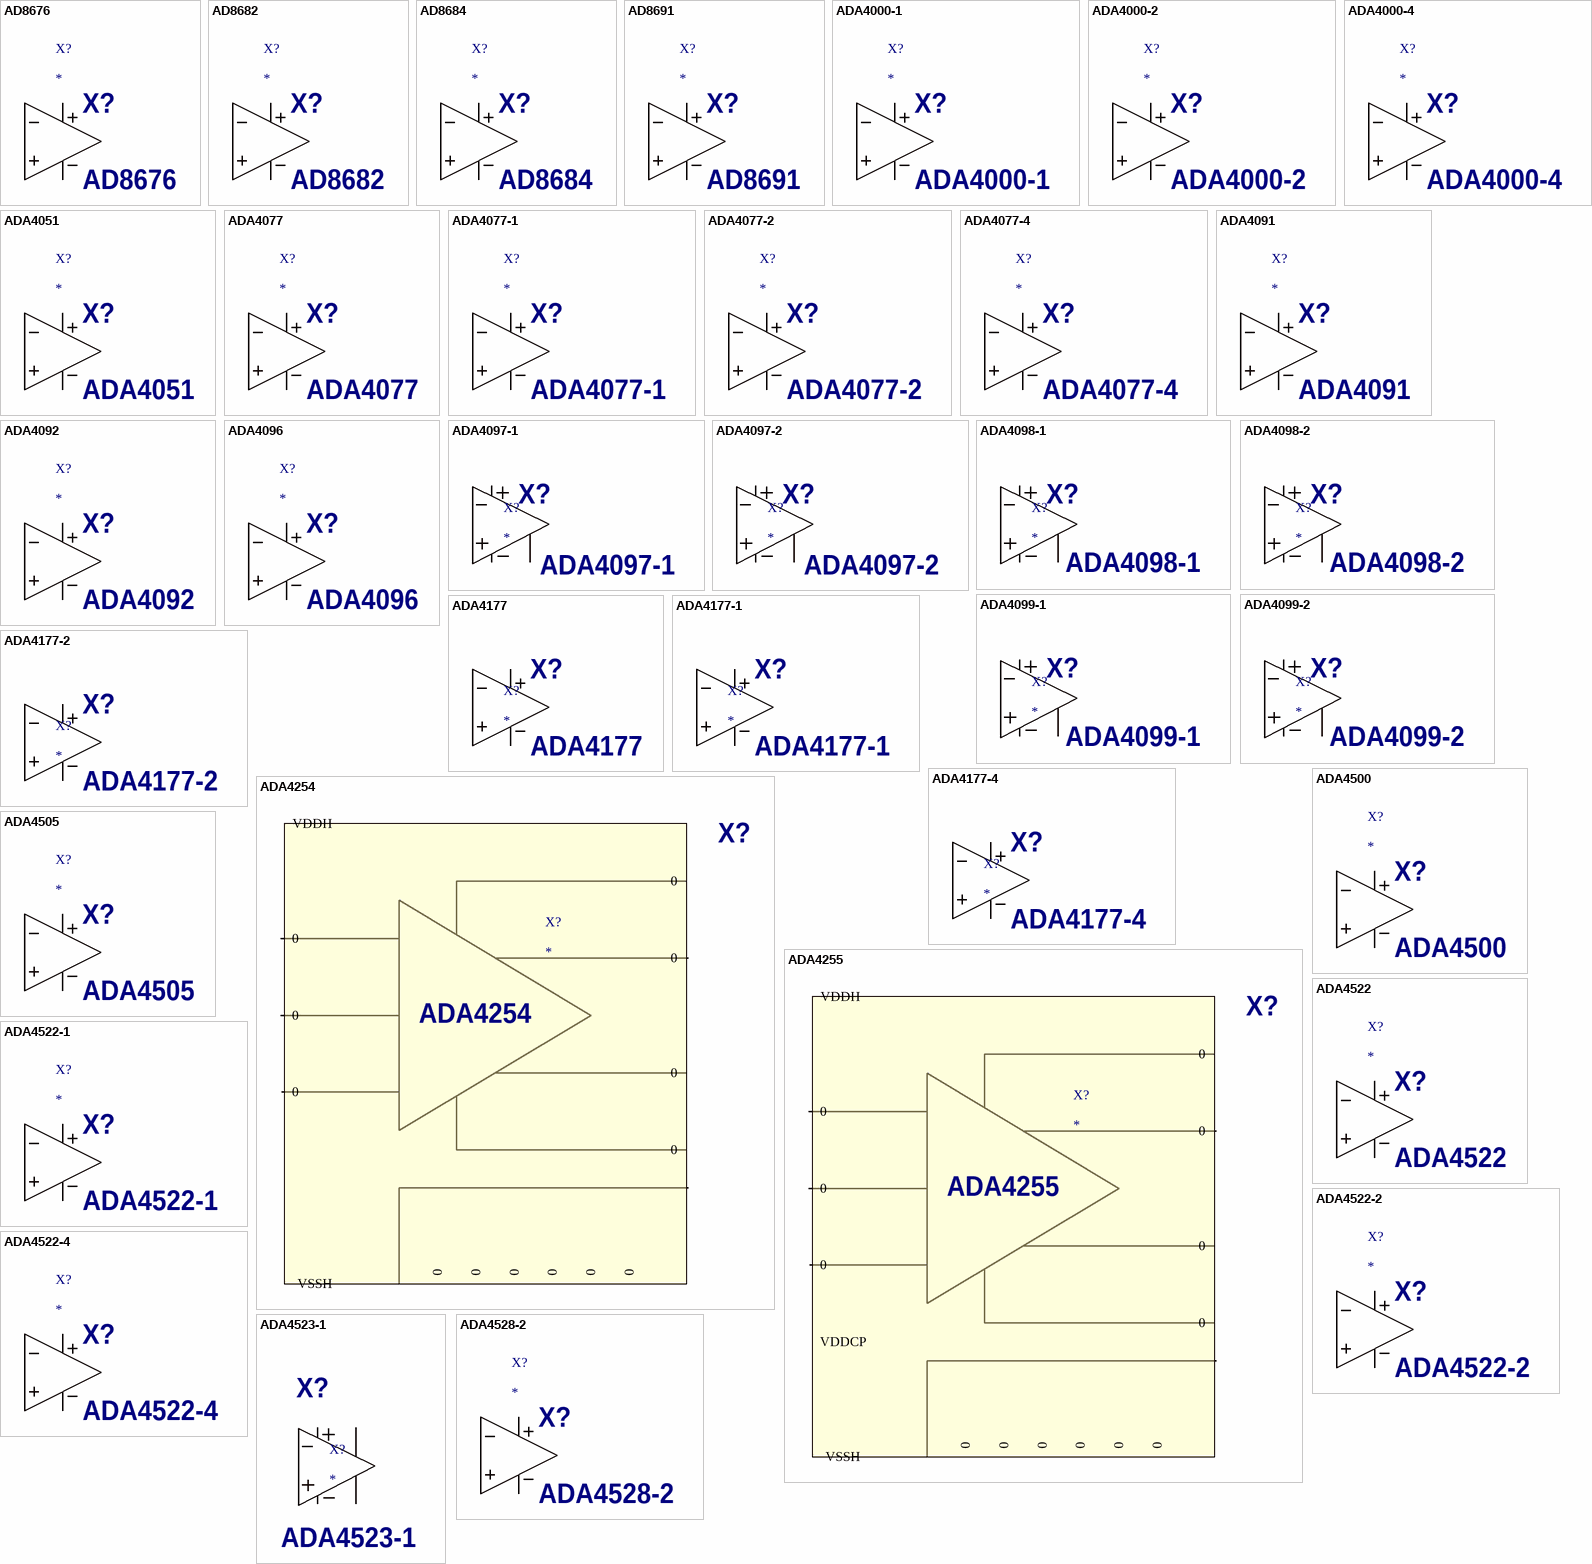
[diagram p3: symbols AD8676 to ADA4528-2]

## AD8676
designator X?  value AD8676  InstName: X?
Prefix: X; Description: Ultraprecision, 36 V, 2.8nV/"Hz Dual Rail-to-Rail Output Op Amp; SpiceModel: AD8676.lib; Value2: AD8676
pins: 1 In+, 2 In-, 3 V+, 4 V-, 5 OUT

## AD8682
designator X?  value AD8682  InstName: X?
Prefix: X; Description: Dual Low Power High Speed JFET Op Amp; SpiceModel: ADI1.lib; Value2: AD8682
pins: 1 In+, 2 In-, 3 V+, 4 V-, 5 OUT

## AD8684
designator X?  value AD8684  InstName: X?
Prefix: X; Description: Quad Low Power High Speed JFET Op Amp; SpiceModel: ADI1.lib; Value2: AD8684
pins: 1 In+, 2 In-, 3 V+, 4 V-, 5 OUT

## AD8691
designator X?  value AD8691  InstName: X?
Prefix: X; Description: 2.7/5V CMOS OP Low Noise Single Supply; SpiceModel: ADI.lib; Value2: AD8691
pins: 1 In+, 2 In-, 3 V+, 4 V-, 5 OUT

## ADA4000-1
designator X?  value ADA4000-1  InstName: X?
Prefix: X; Value2: ADA4000; Description: Low Cost, Precision JFET Input Operational Amplifiers; SpiceModel: ADI.lib
pins: 1 In+, 2 In-, 3 V+, 4 V-, 5 OUT

## ADA4000-2
designator X?  value ADA4000-2  InstName: X?
Prefix: X; Value2: ADA4000; Description: Dual Low Cost, Precision JFET Input Operational Amplifiers; SpiceModel: ADI.lib
pins: 1 In+, 2 In-, 3 V+, 4 V-, 5 OUT

## ADA4000-4
designator X?  value ADA4000-4  InstName: X?
Prefix: X; Value2: ADA4000; Description: Quad Low Cost, Precision JFET Input Operational Amplifiers; SpiceModel: ADI.lib
pins: 1 In+, 2 In-, 3 V+, 4 V-, 5 OUT

## ADA4051
designator X?  value ADA4051  InstName: X?
Prefix: X; Description: 1.8/5V, CMOS, OP, Zero Drift, RRIO; SpiceModel: ADI.lib; Value2: ADA4051
pins: 1 In+, 2 In-, 3 V+, 4 V-, 5 OUT

## ADA4077
designator X?  value ADA4077  InstName: X?
Prefix: X; Description: 4 MHz, 7 nV/rt-Hz, Low Offset and Drift, High Precision Amplifier; SpiceModel: ADA4077.lib; Value2: ADA4077
pins: 1 In+, 2 In-, 3 V+, 4 V-, 5 OUT

## ADA4077-1
designator X?  value ADA4077-1  InstName: X?
Prefix: X; Value2: ADA4077; Description: 4 MHz, 7 nV/rt-Hz, Low Offset and Drift, High Precision Amplifier; SpiceModel: ADA4077.lib
pins: 1 In+, 2 In-, 3 V+, 4 V-, 5 OUT

## ADA4077-2
designator X?  value ADA4077-2  InstName: X?
Prefix: X; Description: Dual 4 MHz, 7 nV/rt-Hz, Low Offset and Drift, High Precision Amplifiers; SpiceModel: ADI.lib; Value2: ADA4077-2
pins: 1 In+, 2 In-, 3 V+, 4 V-, 5 OUT

## ADA4077-4
designator X?  value ADA4077-4  InstName: X?
Prefix: X; Value2: ADA4077; Description: Quad 4 MHz, 7 nV/rt-Hz, Low Offset and Drift, High Precision Amplifiers; SpiceModel: ADA4077.lib
pins: 1 In+, 2 In-, 3 V+, 4 V-, 5 OUT

## ADA4091
designator X?  value ADA4091  InstName: X?
Prefix: X; Description: 2.7/30V BIP OP Low Pwr RRIO; SpiceModel: ADA4091.lib; Value2: ADA4091
pins: 1 In+, 2 In-, 3 V+, 4 V-, 5 OUT

## ADA4092
designator X?  value ADA4092  InstName: X?
Prefix: X; Description: 2.7/30V BIP OP Low Pwr RRIO; SpiceModel: ADI.lib; Value2: ADA4092
pins: 1 In+, 2 In-, 3 V+, 4 V-, 5 OUT

## ADA4096
designator X?  value ADA4096  InstName: X?
Prefix: X; Description: 30 V, Micropower, Overvoltage Protection, Rail-to-Rail Input/Output Amplifiers; SpiceModel: ADA4096.lib; Value2: ADA4096
pins: 1 In+, 2 In-, 3 V+, 4 V-, 5 OUT

## ADA4097-1
designator X?  value ADA4097-1  InstName: X?
Prefix: X; Description: Over-The-Top Rail-to-Rail Input and Output Operational Amplifier with Shutdown; SpiceModel: ADA4097-1.lib; Value2: ADA4097-1
pins: 1 In+, 2 In-, 3 V+, 4 V-, 5 OUT, 6 SD

## ADA4097-2
designator X?  value ADA4097-2  InstName: X?
Prefix: X; Description: Over-The-Top Rail-to-Rail Input and Output Operational Amplifier with Shutdown; SpiceModel: ADA4097-2.lib; Value2: ADA4097-2
pins: 1 In+, 2 In-, 3 V+, 4 V-, 5 OUT, 6 SD

## ADA4098-1
designator X?  value ADA4098-1  InstName: X?
Prefix: X; Description: Over-The-Top Rail-to-Rail Input and Output Operational Amplifier with Shutdown; SpiceModel: ADA4098-1.lib; Value2: ADA4098-1
pins: 1 In+, 2 In-, 3 V+, 4 V-, 5 OUT, 6 SD

## ADA4098-2
designator X?  value ADA4098-2  InstName: X?
Prefix: X; Description: Over-The-Top Rail-to-Rail Input and Output Operational Amplifier with Shutdown; SpiceModel: ADA4098-2.sub; Value2: ADA4098-2
pins: 1 In+, 2 In-, 3 V+, 4 V-, 5 OUT, 6 SD

## ADA4099-1
designator X?  value ADA4099-1  InstName: X?
Prefix: X; Description: Over-The-Top Rail-to-Rail Input and Output Operational Amplifier with Shutdown; SpiceModel: ADA4099-1.lib; Value2: ADA4099-1
pins: 1 In+, 2 In-, 3 V+, 4 V-, 5 OUT, 6 SD

## ADA4099-2
designator X?  value ADA4099-2  InstName: X?
Prefix: X; Description: Over-The-Top Rail-to-Rail Input and Output Operational Amplifier with Shutdown; SpiceModel: ADA4099-2.lib; Value2: ADA4099-2
pins: 1 In+, 2 In-, 3 V+, 4 V-, 5 OUT, 6 SD

## ADA4177
designator X?  value ADA4177  InstName: X?
Prefix: X; Description: OVP and EMI Protected, Precision, Low Noise and Bias Op Amp; Value2: ADA4177; SpiceModel: ADA4177.lib
pins: 1 In+, 2 In-, 3 V+, 4 V-, 5 OUT

## ADA4177-1
designator X?  value ADA4177-1  InstName: X?
Value2: ADA4177; Prefix: X; Description: OVP and EMI Protected, Precision, Low Noise and Bias Op Amp; SpiceModel: ADA4177.lib
pins: 1 In+, 2 In-, 3 V+, 4 V-, 5 OUT

## ADA4177-2
designator X?  value ADA4177-2  InstName: X?
Value2: ADA4177; Prefix: X; Description: Dual OVP and EMI Protected, Precision, Low Noise and Bias Op Amp; SpiceModel: ADA4177.lib
pins: 1 In+, 2 In-, 3 V+, 4 V-, 5 OUT

## ADA4177-4
designator X?  value ADA4177-4  InstName: X?
Value2: ADA4177; Prefix: X; Description: Quad OVP and EMI Protected, Precision, Low Noise and Bias Op Amp; SpiceModel: ADA4177.lib
pins: 1 In+, 2 In-, 3 V+, 4 V-, 5 OUT

## ADA4254
designator X?  value ADA4254  InstName: X?
Prefix: X; SpiceModel: ADA4254.sub; Value2: ADA4254
pins: 0, 0, 0, 0, 0, 0, 0, 0, 0, 0, 0, 0, 0, 3 VDDH, 4 VSSH

## ADA4255
designator X?  value ADA4255  InstName: X?
Prefix: X; ModelFile: ADA4255.lib; Value2: ADA4255
pins: 0, 0, 0, 0, 0, 0, 0, 0, 0, 0, 0, 0, 0, 3 VDDH, 4 VSSH, 16 VDDCP

## ADA4500
designator X?  value ADA4500  InstName: X?
Prefix: X; Description: 2.7/5V CMOS OP ZCO RRIO; SpiceModel: ADI.lib; Value2: ADA4500
pins: 1 In+, 2 In-, 3 V+, 4 V-, 5 OUT

## ADA4505
designator X?  value ADA4505  InstName: X?
Prefix: X; Description: 1.8/5V CMOS OP ZCO RRIO; SpiceModel: ADI.lib; Value2: ADA4505
pins: 1 In+, 2 In-, 3 V+, 4 V-, 5 OUT

## ADA4522
designator X?  value ADA4522  InstName: X?
Prefix: X; Value2: ADA4522-1; Description: 55 V, EMI Enhanced, Zero Drift, Ultralow Noise, Rail-to-Rail Output Op Amp; SpiceModel: ADA4522-1.lib
pins: 1 In+, 2 In-, 3 V+, 4 V-, 5 OUT

## ADA4522-1
designator X?  value ADA4522-1  InstName: X?
Prefix: X; Description: 55 V, EMI Enhanced, Zero Drift, Ultralow Noise, Rail-to-Rail Output Op Amp; SpiceModel: ADA4522-1.lib; Value2: ADA4522-1
pins: 1 In+, 2 In-, 3 V+, 4 V-, 5 OUT

## ADA4522-2
designator X?  value ADA4522-2  InstName: X?
Prefix: X; Description: Dual 55 V, EMI Enhanced, Zero Drift, Ultralow Noise, Rail-to-Rail Output Op Amp; SpiceModel: ADA4522-2.lib; Value2: ADA4522-2
pins: 1 In+, 2 In-, 3 V+, 4 V-, 5 OUT

## ADA4522-4
designator X?  value ADA4522-4  InstName: X?
Prefix: X; Description: Quad 55 V, EMI Enhanced, Zero Drift, Ultralow Noise, Rail-to-Rail Output Op Amp; SpiceModel: ADA4522-4.lib; Value2: ADA4522-4
pins: 1 In+, 2 In-, 3 V+, 4 V-, 5 OUT

## ADA4523-1
designator X?  value ADA4523-1  InstName: X?
Prefix: X; Description: 36V, Low Noise, Zero Drift Op Amp; SpiceModel: ADA4523-1.sub; Value2: ADA4523-1
pins: 1 _SD, 2 IN-, 3 IN+, 4 V-, 5 OUT, 6 V+, 7 SDCOM

## ADA4528-2
designator X?  value ADA4528-2  InstName: X?
Prefix: X; Value2: ADA4528; Description: Dual Precision, Ultralow Noise, RRIO, Zero Drift Op Amp; SpiceModel: ADI.lib
pins: 1 In+, 2 In-, 3 V+, 4 V-, 5 OUT
